# Altium footprint library 采集系统专用库.PcbLib: 18 footprints (part 1 of 2)
Each footprint in its own frame and in the unit in brackets; x right, y up, seen from the top. Pads: shape width x height; smd on the part's side, far side on the other; paste and mask are expansions set on the pad; w line width, h text height; cw(c..) or ccw(c..) is an arc to the next point about the centre after c.
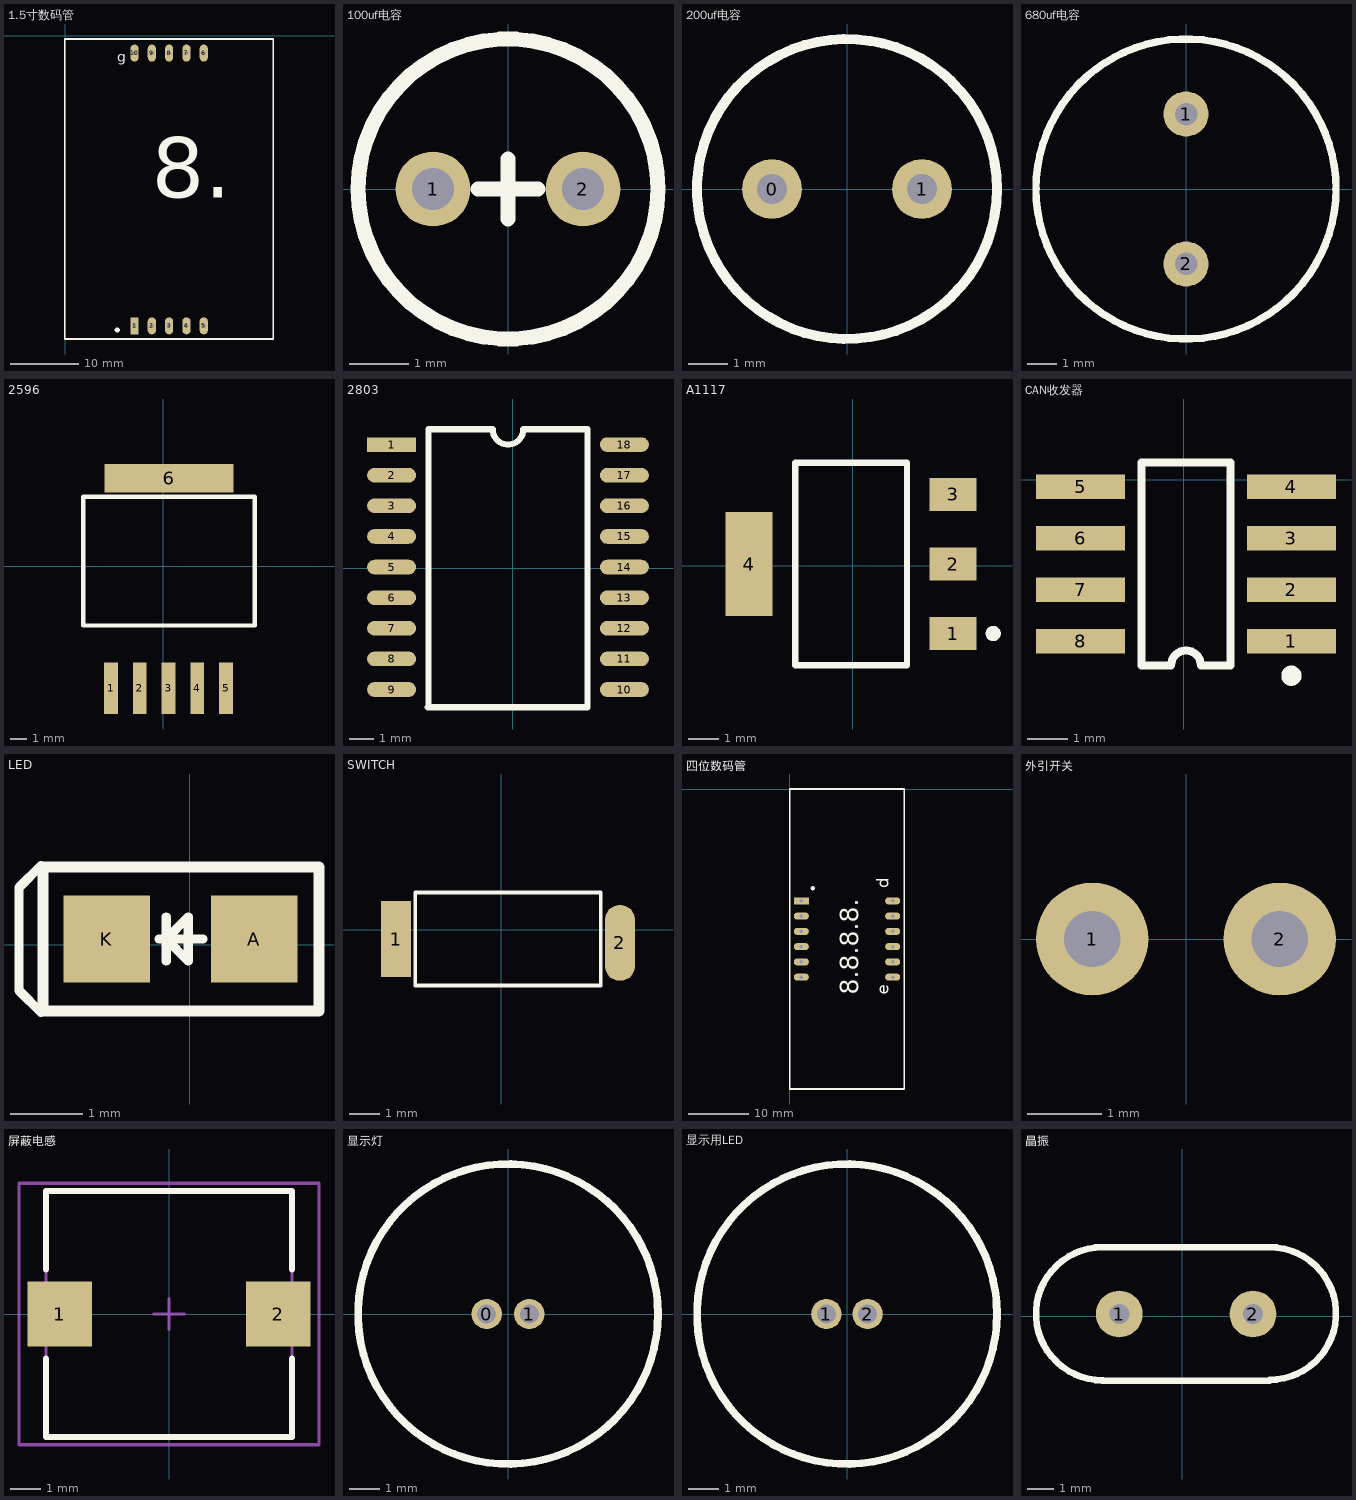
[diagram p0: the footprints below, top view; thin cyan lines are the x and y axes]

## 1.5寸数码管 [mm]
pads (10):
  rect 1.2x2.5 hole 0.6: 1(10.16,-42.54)
  oval 1.2x2.5 hole 0.6: 2(12.7,-42.54) 3(15.24,-42.54) 4(17.78,-42.54) 5(20.32,-42.54) 6(20.32,-2.54) 7(17.78,-2.54) 8(15.24,-2.54) 9(12.7,-2.54) 10(10.16,-2.54)
Top Overlay:
  lines w0.254: -0.081,-44.479 15.218,-44.479 30.518,-44.479 30.518,-0.479 15.218,-0.479 -0.081,-0.479 -0.081,-44.479
  lines w0.762: 7.62,-43.18 7.62,-43.18
  text "g" at 7.62,-3.81 h1.52
  text "8." at 12.7,-26.67 h15.24

## 100uf电容 [mil]
pads (2):
  round 50 hole 28: 1(-50,0) 2(50,0)
Top Overlay:
  circle w10: c0,0 r100
  lines w10: -20,0 20,0 ; 0,-20 0,20

## 200uf电容 [mil]
pads (2):
  round 60 hole 30: 0(-75,0) 1(75,0)
Top Overlay:
  circle w10: c0,0 r150

## 680uf电容 [mil]
pads (2):
  round 60 hole 30: 1(0,100) 2(0,-100)
Top Overlay:
  circle w10: c0,0 r200

## 2596 [mil]
pads (6):
  rect 32x120 smd: 1(-122,-284) 2(-55,-284) 3(12,-284) 4(79,-284) 5(146,-284)
  rect 300x66 smd: 6(13,205)
Top Overlay:
  lines w10: -187,-138 -187,162 213,162 213,-138 -187,-138

## 2803 [mil]
pads (18):
  rect 80x24 smd: 1(-198,202)
  oval 80x24 smd: 2(-198,152) 3(-198,102) 4(-198,52) 5(-198,2) 6(-198,-48) 7(-198,-98) 8(-198,-148) 9(-198,-198) 10(182,-198) 11(182,-148) 12(182,-98) 13(182,-48) 14(182,2) 15(182,52) 16(182,102) 17(182,152) 18(182,202)
Top Overlay:
  lines w10: -139,-227 121,-227 ; -138,-227 -138,227 -33,227 ccw(c-8,227) 17,227 122,227 122,-227

## A1117 [mm]
pads (4):
  rect 1.55x1.1 smd: 1(3.324,-2.249) 2(3.324,0.051) 3(3.324,2.351)
  rect 1.55x3.45 smd: 4(-3.426,0.051)
Top Overlay:
  circle w0.25: c4.649,-2.249 r0.125
  lines w0.2: -1.901,-3.299 -1.901,3.401 1.799,3.401 1.799,-3.299 -1.901,-3.299

## CAN收发器 [mm]
pads (8):
  rect 2.2x0.6 smd: 1(2.651,-3.988) 2(2.651,-2.718) 3(2.651,-1.448) 4(2.651,-0.178) 5(-2.549,-0.178) 6(-2.549,-1.448) 7(-2.549,-2.718) 8(-2.549,-3.988)
Top Overlay:
  circle w0.25: c2.651,-4.838 r0.125
  lines w0.2: -1.049,-4.583 -1.049,0.417 1.151,0.417 1.151,-4.583 0.417,-4.583 ccw(c0.051,-4.583) -0.316,-4.583 -1.049,-4.583

## LED [mil]
pads (2):
  rect 47x47 smd: A(35,3) K(-45,3)
Top Overlay:
  lines w5: -80.75,-37 -92.75,-25 -92.75,31 -80.75,43 ; -16.75,3 7.25,3 ; -12.75,-9 -12.75,15 ; -12.75,3 -0.75,15 -0.75,-9 -12.75,3
  lines w6: -79.75,-36 70.25,-36 70.25,42 -79.75,42 -79.75,-36

## SWITCH [mil]
pads (2):
  rect 39.37x98.43 smd: 1(-136,-12)
  oval 39.37x98.43 smd: 2(154,-17)
Top Overlay:
  lines w5: -111,-72 129,-72 129,48 -111,48 -111,-72

## 四位数码管 [mm]
pads (12):
  rect 2.5x1.2 hole 0.6: 1(1.905,-18.65)
  oval 2.5x1.2 hole 0.6: 2(1.905,-21.19) 3(1.905,-23.73) 4(1.905,-26.27) 5(1.905,-28.81) 6(1.905,-31.35) 7(17.145,-31.35) 8(17.145,-28.81) 9(17.145,-26.27) 10(17.145,-23.73) 11(17.145,-21.19) 12(17.145,-18.65)
Top Overlay:
  lines w0.254: 0,-50 0,0 9.525,0 19.05,0 19.05,-50 9.525,-50 0,-50
  lines w0.762: 3.81,-16.51 3.81,-16.51
  text "8.8.8.8." at 11.43,-34.29 h3.05
  text "e" at 16.51,-34.29 h2.03
  text "d" at 16.51,-16.51 h2.03

## 外引开关 [mil]
pads (2):
  round 60 hole 30: 1(-50,0) 2(50,0)

## 屏蔽电感 [mm]
pads (2):
  rect 2.1x2.1 smd: 1(-3.55,0) 2(3.55,0)
Top Overlay:
  lines w0.2: -4,-1.45 -4,-4 4,-4 4,-1.45 ; -4,1.45 -4,4 4,4 4,1.45
Mechanical 13:
  lines w0.1: -4,-4 4,-4 4,4 -4,4 -4,-4
Mechanical 15:
  lines w0.1: -0.5,0 0.5,0 ; 0,-0.5 0,0.5 ; -4.875,-4.25 4.875,-4.25 4.875,4.25 -4.875,4.25 -4.875,-4.25
3D body: height 4, standoff 0, extent -4,-4 4,4

## 显示灯 [mil]
pads (2):
  round 40 hole 25: 0(-28,0) 1(28,0)
Top Overlay:
  circle w10: c0,0 r196.85

## 显示用LED [mil]
pads (2):
  round 40 hole 25: 1(-27,0) 2(27,0)
Top Overlay:
  circle w10: c0,0 r196.85

## 晶振 [mil]
pads (2):
  round 70 hole 30: 1(-94,3) 2(106,3)
Top Overlay:
  lines w10: -119,-97 131,-97 ; -119,-96.25 cw(c-119,3.38) -119,103 131,103 cw(c131,3.75) 131,-95.49